# Altium footprint library pinghengche.PcbLib: 128 footprints (part 2 of 8)
Each footprint in its own frame and in the unit in brackets; x right, y up, seen from the top. Pads: shape width x height; smd on the part's side, far side on the other; paste and mask are expansions set on the pad; w line width, h text height; cw(c..) or ccw(c..) is an arc to the next point about the centre after c.
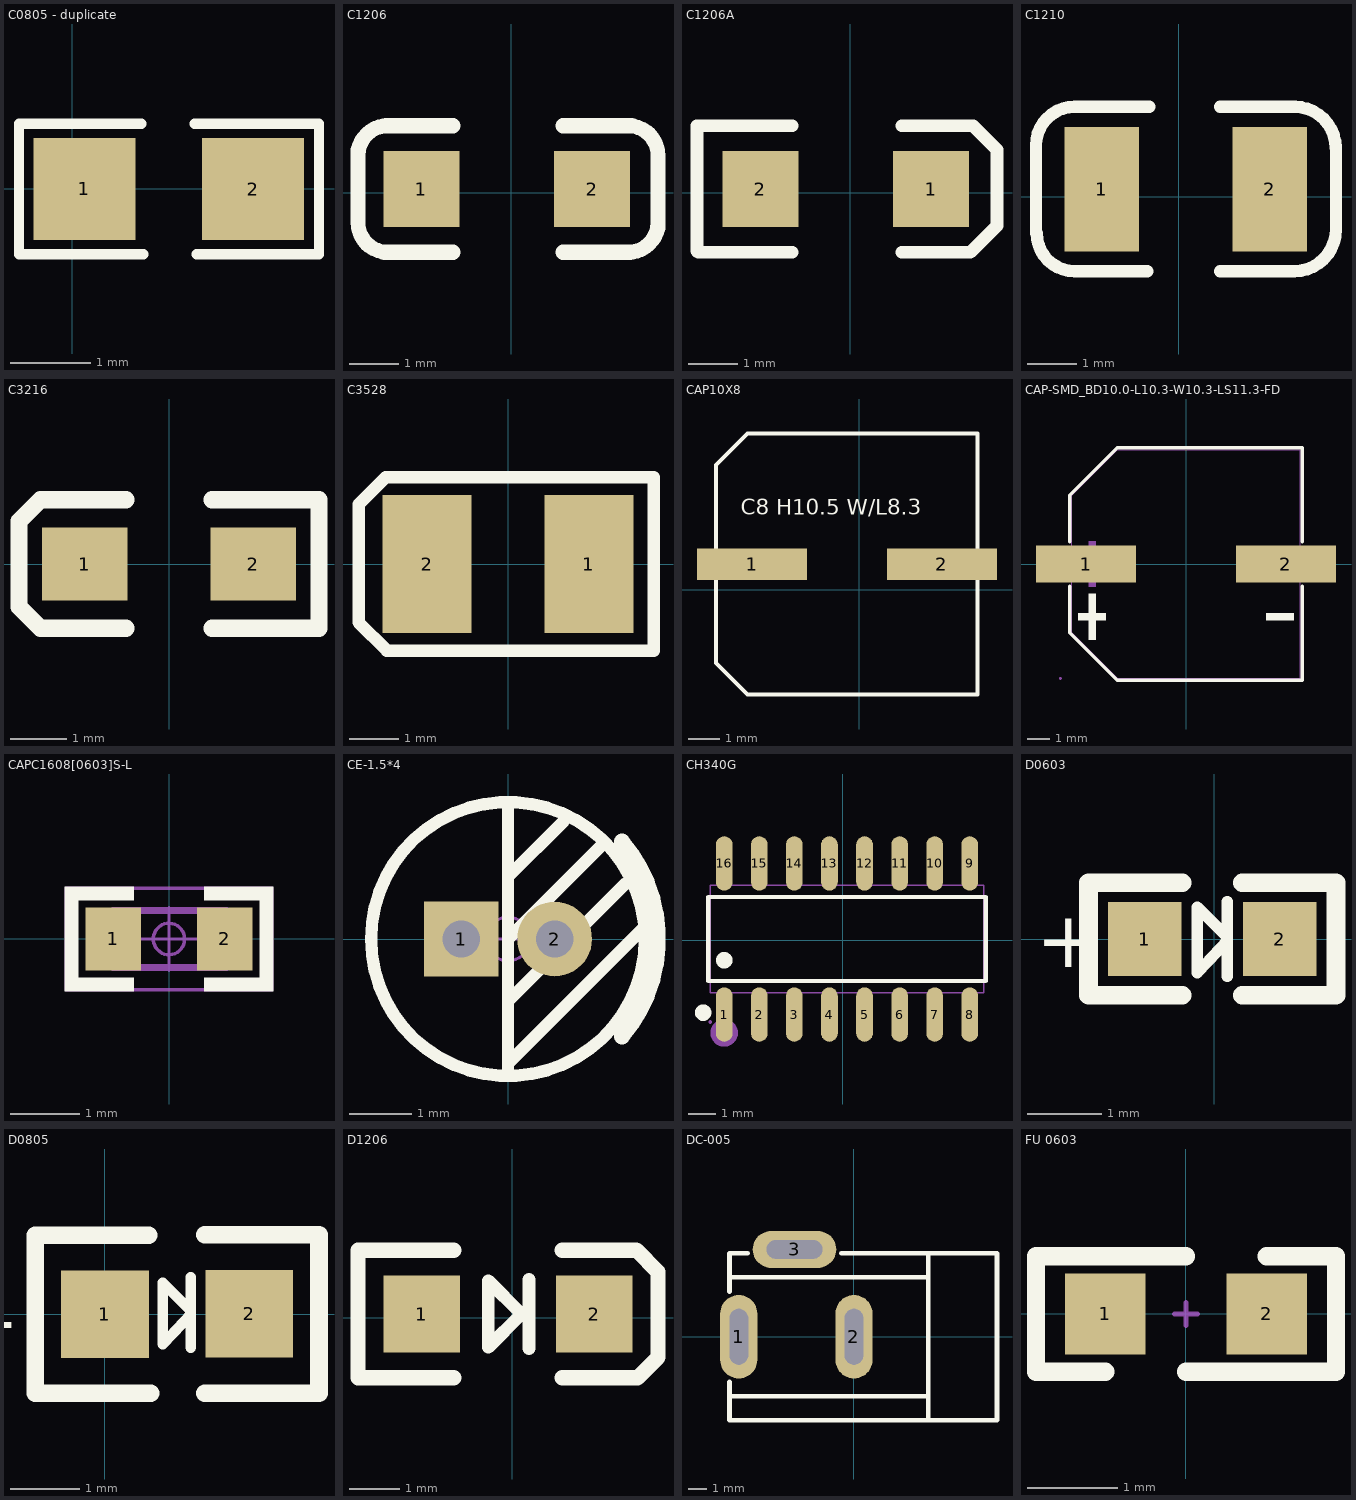
[diagram p1: the footprints below, top view; thin cyan lines are the x and y axes]

## C0805 - duplicate [mil]
pads (2):
  rect 50x50 smd: 1(6,0) 2(88.7,-0.1)
Top Overlay:
  lines w5: 34,32 -26,32 -26,-15 -26,-32 35,-32 ; 60,32 121,32 121,15 121,-32 61,-32
3D body "User Library-0805 SMD Capacitor.STEP": height 30.39, standoff -0.39, extent 7.93,-24.5 86.67,24.71

## C1206 [mil] "3216/A型"
pads (2):
  rect 60x60 smd: 1(-71,3) 2(64,3)
Top Overlay:
  lines w11.81: -121,-23 ccw(c-97.5,-23.5) -98,-47 ; -121,30 cw(c-97.5,29.5) -97,53 ; 92,-47 ccw(c92.5,-23.5) 116,-24 ; 93,53 cw(c92.5,29.5) 116,29
  lines w12: -121,-24 -121,34 ; -100,-47 -46,-47 ; -99,53 -46,53 ; 41,-47 94,-47 ; 41,53 95,53 ; 116,-28 116,30
3D body "Capacitor 1206 SMD1.step": height 39.45, standoff 0, extent -66.99,-28.49 58.99,34.5

## C1206A [mil] "3216/A型"
pads (2):
  rect 60x60 smd: 1(64,3) 2(-71,3)
Top Overlay:
  lines w10: -121,53 -121,-46 -120,-47 -46,-47 ; -120,53 -46,53 ; 41,-47 94,-47 ; 41,53 95,53 ; 94,53 97,53 116,34 116,-26 95,-47
3D body "Capacitor 1206 SMD1.step": height 39.45, standoff 0, extent -66.99,-28.49 58.99,34.5

## C1210 [mil]
pads (2):
  rect 60x100 smd: 1(-62,6) 2(73,6)
Top Overlay:
  lines w10: -114.8,-29.36 -114.8,41.08 cw(c-83.75,41.08) -83.75,72.13 ; -114.27,-29.36 ccw(c-83.63,-29.36) -83.63,-60 -25.3,-60 ; -83.75,72 -24,72 ; 33,-60 92.52,-60 ccw(c92.52,-26.32) 126.2,-26.32 126.2,39.82 ; 33,72 93.32,72 ; 93,72 cw(c93,39.12) 125.88,39.12
3D body "1210(3225M) Cap.STEP": height 67.1, standoff 0, extent -72.75,-44 84.75,54

## C3216 [mil] "A型/1206"
pads (2):
  rect 60x51.18 smd: 1(-59,0) 2(59,0)
Top Overlay:
  lines w12: -30,-45 -90,-45 -105,-30 -105,30 -90,45 -30,45 ; 30,-45 105,-45 105,45 30,45
3D body "TAJ-A.STEP": height 62.99, standoff 0, extent -63,-31 62.99,31.99

## C3528 [mil] "B型"
pads (2):
  rect 70.87x110 smd: 1(64.5,0) 2(-64.5,0)
Top Overlay:
  lines w10: -119,-46.5 -96.5,-69 116,-69 116,69 -97.5,69 -119,47.5 -119,-46.5
3D body "TAJ-B.STEP": height 74.8, standoff 0, extent -68.9,-55.11 68.9,55.12

## CAP10X8 [mm]
pads (2):
  rect 3.5x1 smd: 1(-3.409,0.8) 2(2.629,0.8)
Top Overlay:
  lines w0.127: -4.548,0.413 -4.548,-2.337 -3.548,-3.337 3.752,-3.337 3.752,0.413 ; -4.548,1.213 -4.548,3.963 -3.548,4.963 3.752,4.963 3.752,1.213
  text "C8 H10.5 W/L8.3" at -3.772,2.378 h0.5
3D body "SL-H-DXF.STEP": height 10.5, standoff 0, extent -4.842,-3.292 4.158,5.008

## CAP-SMD_BD10.0-L10.3-W10.3-LS11.3-FD [mm]
pads (2):
  rect 4.5x1.65 smd: 1(-4.5,0) 2(4.5,0)
Top Overlay:
  region: -4.378,-1.339 -4.378,-3.399 -4.068,-3.399 -4.068,-1.339
  region: -4.841,-2.214 -4.841,-2.523 -3.605,-2.523 -3.605,-2.214
  region: 4.841,-2.214 4.841,-2.523 3.605,-2.523 3.605,-2.214
  lines w0.152: -5.226,-1.005 -5.226,-3.09 -3.09,-5.226 5.226,-5.226 5.226,-1.005 ; -5.226,1.005 -5.226,3.09 -3.09,5.226 5.226,5.226 5.226,1.005
Mechanical 6:
  region: -4.378,1.03 -4.378,-1.03 -4.068,-1.03 -4.068,1.03
  region: -4.841,0.155 -4.841,-0.155 -3.605,-0.155 -3.605,0.155
  region: 4.841,0.155 4.841,-0.155 3.605,-0.155 3.605,0.155
Mechanical 15:
  region: -5.59,-5.15 -5.59,-5.125 -5.625,-5.09 -5.675,-5.09 -5.71,-5.125 -5.71,-5.15 -5.71,-5.175 -5.675,-5.21 -5.625,-5.21 -5.59,-5.175 -5.59,-5.15
  region: 2.3,0.475 5.65,0.475 5.65,-0.475 2.3,-0.475
  region: -5.65,0.475 -2.3,0.475 -2.3,-0.475 -5.65,-0.475
  lines w0.051: -5.15,-3.09 -3.09,-5.15 5.15,-5.15 5.15,5.15 -3.09,5.15 -5.15,3.09 -5.15,-3.09

## CAPC1608[0603]S-L [mm]
height 2
pads (2):
  rect 0.8x0.9 smd: 1(-0.8,0) 2(0.8,0)
Top Overlay:
  rectangle: -1.5,0.55 -0.5,0.75
  region: -1.5,0.75 -1.5,-0.75 -1.3,-0.75 -1.3,0.75
  rectangle: -1.5,-0.75 -0.5,-0.55
  region: 1.5,-0.55 0.5,-0.55 0.5,-0.75 1.5,-0.75
  region: 1.5,-0.75 1.5,0.75 1.3,0.75 1.3,-0.75
  region: 1.5,0.75 0.5,0.75 0.5,0.55 1.5,0.55
Top Component Center:
  circle w0.05: c0,0 r0.225
  lines w0.05: -0.45,0 0.45,0 ; 0,-0.45 0,0.45
Top Component Outline:
  lines w0.05: -1.475,-0.725 -1.475,0.725 1.475,0.725 1.475,-0.725 -1.475,-0.725
Top Designator:
  text ".Designator" at -2.252,-0.226 h1
Mechanical 13:
  lines w0.1: -0.8,-0.406 0.825,-0.406 0.825,0.406 -0.8,0.406 -0.8,-0.406
3D body: height 0.79, standoff 0, extent -0.8,-0.406 -0.45,0.406
3D body: height 0.79, standoff 0, extent 0.45,-0.406 0.8,0.407
3D body: height 0.79, standoff 0, extent -0.45,-0.406 0.45,0.406

## CE-1.5*4 [mm] "直插电解电容-脚距1.5mm直径4mm高度8mm"
pads (2):
  rect 1.2x1.2 hole 0.6: 1(-0.75,0)
  round 1.2 hole 0.6: 2(0.75,0)
Top Overlay:
  circle w0.2: c0,0 r2.2
  lines w0.2: 0,-2.159 0,-2 ; 0,-1 1.897,0.897 ; 0,0 1.524,1.524 ; 0,1 0.897,1.897 ; 0,2.159 0,-2 ; 2.207,0.206 0,-2
  lines w0.254: 1.83,-1.568 ccw(c0,0) 1.83,1.568
Mechanical 15:
  circle w0.05: c0,0 r0.35
  lines w0.05: -0.5,0 0.5,0 ; 0,-0.5 0,0.5
3D body "CE_TH_1_5x4x8-4347.STEP": height 8.15, standoff -3.35, extent -2,-1.999 2.02,2

## CH340G [mm]
pads (16):
  oval 0.602x1.971 smd mask+0.051: 1(-4.295,-2.698) 2(-3.025,-2.698) 3(-1.755,-2.698) 4(-0.485,-2.698) 5(0.785,-2.698) 6(2.055,-2.698) 7(3.325,-2.698) 8(4.595,-2.698) 9(4.595,2.774) 10(3.325,2.774) 11(2.055,2.774) 12(0.785,2.774) 13(-0.485,2.774) 14(-1.755,2.774) 15(-3.025,2.774) 16(-4.295,2.774)
Top Overlay:
  circle w0.3: c-4.295,-0.731 r0.15
  circle w0.3: c-5.057,-2.629 r0.15
  lines w0.152: -4.876,-1.483 -4.876,1.559 5.176,1.559 5.176,-1.483 -4.876,-1.483
Mechanical 6:
  circle w0.5: c-4.295,-3.362 r0.25
Mechanical 15:
  drawing of 37 lines, arcs and shapes, not listed

## D0603 [mm]
pads (2):
  rect 1x1 smd: 1(-0.94,0) 2(0.889,0)
Top Overlay:
  lines w0.152: 0.178,-0.508 0.178,0.508 ; 0.178,-0.025 -0.229,-0.457 -0.229,0.432 0.178,0.025
  lines w0.254: -0.432,-0.762 -1.702,-0.762 -1.702,0.762 -0.432,0.762 ; 0.381,-0.762 1.651,-0.762 1.651,0.762 0.381,0.762
  text "+" at -2.413,-0.381 h0.76
3D body: height 0.46, standoff 0, extent -0.28,-0.279 0.255,0.279
3D body: height 0.38, standoff 0, extent -0.603,-0.533 0.567,0.533
3D body: height 0.38, standoff 0, extent -1.026,-0.535 -0.602,0.535
3D body: height 0.38, standoff 0, extent 0.563,-0.532 0.988,0.532

## D0805 [mm] "1/8W"
pads (2):
  rect 1.27x1.27 smd: 1(0,0) 2(2.09,0.005)
Top Overlay:
  lines w0.152: 1.245,-0.483 1.245,0.533 ; 1.245,0 0.838,-0.432 0.838,0.457 1.245,0.051
  lines w0.254: 0.635,1.143 -1.011,1.143 -1.011,-1.143 0.66,-1.143 ; 1.448,-1.143 3.099,-1.143 3.099,1.148 1.448,1.148
  text "+" at -1.245,-0.483 h0.76
3D body "R0805.STEP": height 0.55, standoff 0, extent 0.036,-0.62 2.036,0.64
3D body: height 0.46, standoff 0, extent 0.787,-0.254 1.322,0.305

## D1206 [mil] "1/4W"
pads (2):
  rect 60x60 smd: 1(-71,3) 2(64,3)
Top Overlay:
  lines w10: 13,-24 13,30 ; -19,-23 7,3 -19,29 -19,-12 -19,-23
  lines w12: -46,-47 -121,-47 -121,53 -46,53 ; 39,-47 98,-47 114,-31 114,36 97,53 39,53
3D body "SOD-80.STEP": height 59.06, standoff 0, extent -72.9,-26.53 64.9,32.53

## DC-005 [mm] "DC母座5.5mm"
height 12.75
pads (3):
  oval 2x4.5 hole 1 slot 3 at 90 deg: 1(-6.2,0) 2(0,0)
  oval 4.5x2 hole 1 slot 3 at 0 deg: 3(-3.2,4.7)
Top Overlay:
  lines w0.254: -6.7,-3.2 3.92,-3.2 ; -6.7,-2.424 -6.7,-4.5 7.7,-4.5 7.7,4.5 -0.685,4.5 ; -6.7,2.425 -6.7,4.5 -5.715,4.5 ; -6.7,3.2 3.92,3.2 ; 4,-4.5 4,4.5
3D body "DC-005.STEP": height 11.25, standoff -3.75, extent -6.55,-4.5 7.5,4.8

## FU 0603 [mil] "贴片保险丝"
pads (2):
  rect 35x35 smd: 1(-35,0) 2(35,0)
Top Overlay:
  lines w8: -35,-25 -65,-25 -65,25 -40,25 0,25 ; 0,-25 40,-25 65,-25 65,25 35,25
Mechanical 15:
  lines w2: -5,0 5,0 ; 0,-5 0,0 0,5
3D body "FU_0603.STEP": height 20.47, standoff 0, extent -31.49,-16.13 31.5,16.15